# Altium footprint library YQPOWER.PcbLib: 215 footprints (part 8 of 14)
Each footprint in its own frame and in the unit in brackets; x right, y up, seen from the top. Pads: shape width x height; smd on the part's side, far side on the other; paste and mask are expansions set on the pad; w line width, h text height; cw(c..) or ccw(c..) is an arc to the next point about the centre after c.
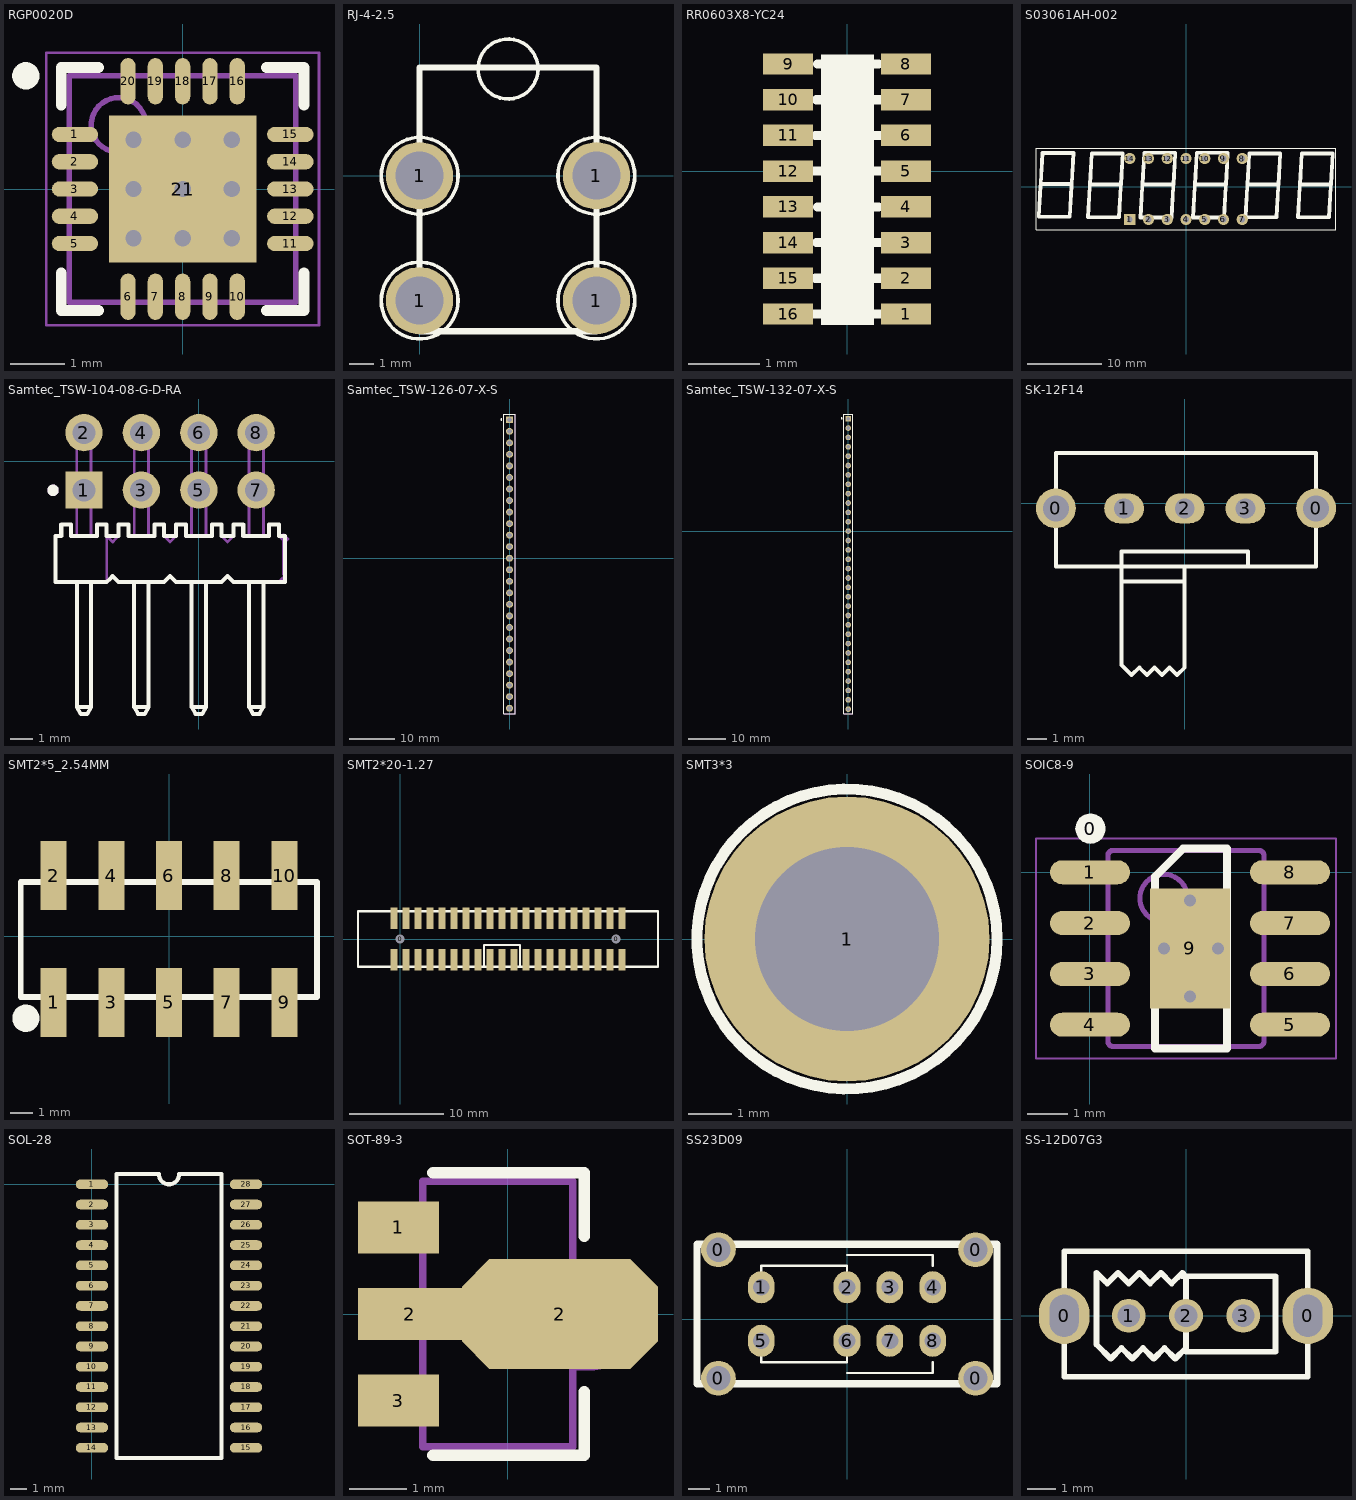
[diagram p7: the footprints below, top view; thin cyan lines are the x and y axes]

## RGP0020D [mm] "QFN, 20-Leads, Body 4x4mm, Pitch 0.5mm, Thermal Pad 2.7x2.7mm, TI Recommended"
height 1
pads (21):
  oval 0.85x0.28 smd paste-0.025 mask+0.07: 1(-1.975,1) 2(-1.975,0.5) 3(-1.975,0) 4(-1.975,-0.5) 5(-1.975,-1) 11(1.975,-1) 12(1.975,-0.5) 13(1.975,0) 14(1.975,0.5) 15(1.975,1)
  oval 0.28x0.85 smd paste-0.025 mask+0.07: 6(-1,-1.975) 7(-0.5,-1.975) 8(0,-1.975) 9(0.5,-1.975) 10(1,-1.975) 16(1,1.975) 17(0.5,1.975) 18(0,1.975) 19(-0.5,1.975) 20(-1,1.975)
  rect 2.7x2.7 smd paste-1.35 mask+0.07: 21(0,0)
via -0.9,0.9 diameter 0.5 hole 0.3
via 0,-0.9 diameter 0.5 hole 0.3
via -0.9,-0.9 diameter 0.5 hole 0.3
via 0.9,0 diameter 0.5 hole 0.3
via 0,0 diameter 0.5 hole 0.3
via -0.9,0 diameter 0.5 hole 0.3
via 0.9,-0.9 diameter 0.5 hole 0.3
via 0,0.9 diameter 0.5 hole 0.3
via 0.9,0.9 diameter 0.5 hole 0.3
Top Overlay:
  circle w0.25: c-2.875,2.075 r0.125
  lines w0.2: -2.225,-1.54 -2.225,-2.225 -1.54,-2.225 ; -2.225,1.54 -2.225,2.225 -1.54,2.225 ; 1.54,-2.225 2.225,-2.225 2.225,-1.54 ; 1.54,2.225 2.225,2.225 2.225,1.54
Top Paste:
  rectangle: 0.15,0.15 1.25,1.25
  region: -0.15,1.25 -1.25,1.25 -1.25,0.15 -0.15,0.15
  region: -0.15,-0.15 -1.25,-0.15 -1.25,-1.25 -0.15,-1.25
  rectangle: 0.15,-1.25 1.25,-0.15
Mechanical 5:
  circle w0.1: c-1.175,1.175 r0.5
  lines w0.1: -2.075,-2.075 2.075,-2.075 2.075,2.075 -2.075,2.075 -2.075,-2.075
  text ".Designator" at -1.854,-0.508 h1.02
Mechanical 15:
  lines w0.05: -2.5,-2.5 2.5,-2.5 2.5,2.5 -2.5,2.5 -2.5,-2.5
  lines w0.1: -0.5,0 0.5,0 ; 0,-0.5 0,0.5
3D body: height 1, standoff 0, extent -2.075,-2.075 2.075,2.075

## RJ-4-2.5 [mm]
pads (4):
  round 2.8 hole 2: 1(0,-5.2) 1(0,0) 1(7.366,-5.2) 1(7.366,0)
Top Overlay:
  circle w0.15: c7.366,0 r1.6
  circle w0.15: c0,0 r1.6
  circle w0.15: c7.366,-5.2 r1.6
  circle w0.15: c0,-5.2 r1.6
  circle w0.15: c3.683,4.445 r1.25
  lines w0.254: 7.239,-6.477 -0.011,-6.477 -0.011,4.5 7.366,4.5 7.366,-6.477 ; 7.239,-6.477 7.366,-6.477 ; 7.239,-6.477 7.366,-6.477

## RR0603X8-YC24 [mm] "排阻"
pads (16):
  rect 0.7x0.3 smd: 1(0.825,-2) 2(0.825,-1.5) 3(0.825,-1) 4(0.825,-0.5) 5(0.825,0) 6(0.825,0.5) 7(0.825,1) 8(0.825,1.5) 9(-0.825,1.5) 10(-0.825,1) 11(-0.825,0.5) 12(-0.825,0) 13(-0.825,-0.5) 14(-0.825,-1) 15(-0.825,-1.5) 16(-0.825,-2)
Top Overlay:
  region: 0.375,1.632 -0.365,1.632 -0.365,-2.157 0.375,-2.157
  lines w0.127: -0.455,-2 0.455,-2 ; -0.455,0 0.455,0 ; -0.445,-1.5 0.455,-1.5 ; -0.445,0.5 0.455,0.5 ; -0.425,-1 0.455,-1 ; -0.425,1 0.455,1 ; -0.415,-0.5 0.445,-0.5 ; -0.415,1.5 0.445,1.5

## S03061AH-002 [mil] "6位数码管"
pads (14):
  rect 60x60 hole 30: 1(-300,-175)
  round 60 hole 30: 2(-200,-175) 3(-100,-175) 4(0,-175) 5(100,-175) 6(200,-175) 7(300,-175) 8(300,150) 9(200,150) 10(100,150) 11(0,150) 12(-100,150) 13(-200,150) 14(-300,150)
Top Overlay:
  lines w5: -800,-230 -800,205 800,205 800,-230 -800,-230
  lines w19.68: -776.3,5.35 -785.35,-160 -620,-160 -610.94,5.35 ; -513.94,2.65 -523,-162.7 -357.65,-162.7 -348.59,2.65 ; -233.94,2.65 -243.13,-165 -77.77,-165 -68.59,2.65 ; -223,177.3 -232.06,11.94 -66.7,11.94 -57.65,177.3 ; -223,180.84 -57.65,180.84 ; 46.06,2.65 36.87,-165 202.23,-165 211.41,2.65 ; 57,177.3 47.94,11.94 213.3,11.94 222.35,177.3 ; 57,180.84 222.35,180.84 ; 326.06,2.65 317,-162.7 482.35,-162.7 491.41,2.65 ; 606.06,2.65 597,-162.7 762.35,-162.7 771.41,2.65 ; -774.41,14.65 -609.06,14.65 -600,180 -765.35,180 -774.41,14.65 ; -512.06,11.94 -503,177.3 -337.65,177.3 -346.7,11.94 -512.06,11.94 ; 327.94,11.94 337,177.3 502.35,177.3 493.3,11.94 327.94,11.94 ; 607.94,11.94 617,177.3 782.35,177.3 773.3,11.94 607.94,11.94

## Samtec_TSW-104-08-G-D-RA [mm] "Samtec Right Angle Header"
height 5.563
pads (8):
  rect 1.65x1.65 hole 1 mask+0: 1(-5.08,-1.27)
  round 1.65 hole 1 mask+0: 2(-5.08,1.27) 3(-2.54,-1.27) 4(-2.54,1.27) 5(0,-1.27) 6(0,1.27) 7(2.54,-1.27) 8(2.54,1.27)
Top Overlay:
  circle w0.25: c-6.45,-1.28 r0.125
  lines w0.178: -5.397,-5.334 -5.397,-10.871 ; -4.763,-5.334 -4.763,-10.871 ; -2.857,-5.334 -2.857,-10.871 ; -2.222,-5.334 -2.222,-10.871 ; -0.318,-5.334 -0.318,-10.871 ; 0.318,-5.334 0.318,-10.871 ; 2.222,-5.334 2.222,-10.871 ; 2.857,-5.334 2.857,-10.871 ; -5.397,-10.871 -5.222,-11.176 -4.938,-11.176 -4.763,-10.871 ; -5.397,-10.871 -4.763,-10.871 ; -2.857,-10.871 -2.682,-11.176 -2.398,-11.176 -2.222,-10.871 ; -2.857,-10.871 -2.222,-10.871 ; -0.318,-10.871 -0.142,-11.176 0.142,-11.176 0.318,-10.871 ; -0.318,-10.871 0.318,-10.871 ; 2.222,-10.871 2.857,-10.871 ; 2.222,-10.871 2.398,-11.176 2.682,-11.176 2.857,-10.871 ; -6.35,-5.334 -6.35,-3.302 -6.086,-3.302 -6.086,-2.794 -5.654,-2.794 -5.654,-3.302 -4.506,-3.302 -4.506,-2.794 -4.074,-2.794 -4.074,-3.302 -3.546,-3.302 -3.546,-2.794 -3.114,-2.794 -3.114,-3.302 -1.966,-3.302 -1.966,-2.794 -1.534,-2.794 -1.534,-3.302 -1.006,-3.302 -1.006,-2.794 -0.574,-2.794 -0.574,-3.302 0.574,-3.302 0.574,-2.794 1.006,-2.794 1.006,-3.302 1.534,-3.302 1.534,-2.794 1.966,-2.794 1.966,-3.302 3.114,-3.302 3.114,-2.794 3.546,-2.794 3.546,-3.302 3.81,-3.302 3.81,-5.334 1.534,-5.334 1.397,-5.197 1.27,-5.07 1.143,-5.197 1.006,-5.334 -1.006,-5.334 -1.143,-5.197 -1.27,-5.07 -1.397,-5.197 -1.534,-5.334 -3.546,-5.334 -3.683,-5.197 -3.81,-5.07 -3.937,-5.197 -4.074,-5.334 -6.35,-5.334
Mechanical 5:
  circle w0.25: c-6.45,-1.28 r0.125
  lines w0.127: -5.397,-5.334 -5.397,-10.871 ; -5.397,-3.302 -5.397,0.826 -5.397,1.587 -4.763,1.587 -4.763,0.826 -4.763,-3.302 ; -4.763,-5.334 -4.763,-10.871 ; -2.857,-5.334 -2.857,-10.871 ; -2.857,-3.302 -2.857,0.826 -2.857,1.587 -2.222,1.587 -2.222,0.826 -2.222,-3.302 ; -2.222,-5.334 -2.222,-10.871 ; -0.318,-5.334 -0.318,-10.871 ; -0.318,-3.302 -0.318,0.826 -0.318,1.587 0.318,1.587 0.318,0.826 0.318,-3.302 ; 0.318,-5.334 0.318,-10.871 ; 2.222,-5.334 2.222,-10.871 ; 2.222,-3.302 2.222,0.826 2.222,1.587 2.857,1.587 2.857,0.826 2.857,-3.302 ; 2.857,-5.334 2.857,-10.871 ; 3.746,-5.006 3.746,-3.249 3.937,-3.439 3.81,-3.566 3.683,-3.439 3.546,-3.302 3.546,-2.794 3.114,-2.794 3.114,-3.302 1.966,-3.302 1.966,-2.794 1.534,-2.794 1.534,-3.302 1.397,-3.439 1.27,-3.566 1.143,-3.439 1.006,-3.302 1.006,-2.794 0.574,-2.794 0.574,-3.302 -0.574,-3.302 -0.574,-2.794 -1.006,-2.794 -1.006,-3.302 -1.143,-3.439 -1.27,-3.566 -1.397,-3.439 -1.534,-3.302 -1.534,-2.794 -1.966,-2.794 -1.966,-3.302 -3.114,-3.302 -3.114,-2.794 -3.546,-2.794 -3.546,-3.302 -3.683,-3.439 -3.81,-3.566 -3.937,-3.439 -4.074,-3.302 ; 3.81,-5.07 3.683,-5.197 3.546,-5.334 1.534,-5.334 1.397,-5.197 1.27,-5.07 1.143,-5.197 1.006,-5.334 -1.006,-5.334 -1.143,-5.197 -1.27,-5.07 -1.397,-5.197 -1.534,-5.334 -3.546,-5.334 -3.683,-5.197 -3.81,-5.07 -3.937,-5.197 -4.074,-5.334 ; -5.397,-10.871 -4.763,-10.871 ; -5.397,-10.871 -5.222,-11.176 -4.938,-11.176 -4.763,-10.871 ; -4.074,-5.334 -6.35,-5.334 -6.35,-3.302 -6.086,-3.302 -6.086,-2.794 -5.654,-2.794 -5.654,-3.302 -4.506,-3.302 -4.506,-2.794 -4.074,-2.794 -4.074,-3.302 ; -4.074,-5.334 -4.074,-3.302 ; -2.857,-10.871 -2.222,-10.871 ; -2.857,-10.871 -2.682,-11.176 -2.398,-11.176 -2.222,-10.871 ; -0.318,-10.871 0.318,-10.871 ; -0.318,-10.871 -0.142,-11.176 0.142,-11.176 0.318,-10.871 ; 2.222,-10.871 2.398,-11.176 2.682,-11.176 2.857,-10.871 ; 2.222,-10.871 2.857,-10.871
  text ".Designator" at -5.91,-7.42 h1.02
3D body: height 5.64, standoff -2.24, extent -6.35,-11.176 3.81,1.588

## Samtec_TSW-126-07-X-S [mil] "Samtec"
height 330
pads (26):
  rect 60x60 hole 40: 1(0,1200)
  round 60 hole 40: 2(0,1100) 3(0,1000) 4(0,900) 5(0,800) 6(0,700) 7(0,600) 8(0,500) 9(0,400) 10(0,300) 11(0,200) 12(0,100) 13(0,0) 14(0,-100) 15(0,-200) 16(0,-300) 17(0,-400) 18(0,-500) 19(0,-600) 20(0,-700) 21(0,-800) 22(0,-900) 23(0,-1000) 24(0,-1100) 25(0,-1200) 26(0,-1300)
Top Overlay:
  circle w10: c-71.23,1202.35 r5.35
  lines w7: -50,-1350 50,-1350 50,1250 -50,1250 -50,-1350
Mechanical 5:
  rectangle: -26.47,1174.63 26.59,1224.38
  lines w5: -50,-1350 50,-1350 50,1250 -50,1250 -50,-1350
  text ".Designator" at -20,80 h40
3D body "Samtec_TSW-125-07-X-S.stp": height 330.6, standoff -99.4, extent -50,-1350 50,1150

## Samtec_TSW-132-07-X-S [mil] "Samtec"
height 330
pads (32):
  rect 60x60 hole 40: 1(0,1200)
  round 60 hole 40: 2(0,1100) 3(0,1000) 4(0,900) 5(0,800) 6(0,700) 7(0,600) 8(0,500) 9(0,400) 10(0,300) 11(0,200) 12(0,100) 13(0,0) 14(0,-100) 15(0,-200) 16(0,-300) 17(0,-400) 18(0,-500) 19(0,-600) 20(0,-700) 21(0,-800) 22(0,-900) 23(0,-1000) 24(0,-1100) 25(0,-1200) 26(0,-1300) 27(0,-1400) 28(0,-1500) 29(0,-1600) 30(0,-1700) 31(0,-1800) 32(0,-1900)
Top Overlay:
  circle w10: c-71.23,1202.35 r5.35
  lines w7: -50,-1951.57 -50,1250 50,1250 50,-1951.57 -50,-1951.57
Mechanical 5:
  rectangle: -26.47,1174.63 26.59,1224.38
  lines w5: -50,-1949.61 -50,1250 50,1250 50,-1949.61 -50,-1949.61
  text ".Designator" at -20,80 h40
3D body: height 10, standoff 0, extent -50,-1950.79 50,1250

## SK-12F14 [mm] "开关选择"
pads (5):
  round 2 hole 1.3: 0(-6.477,-0.254) 0(6.604,-0.254)
  oval 2x1.5 hole 1: 1(-3.048,-0.254) 2(0,-0.254) 3(3.048,-0.254)
Top Overlay:
  lines w0.2: -6.477,-3.175 6.604,-3.175 6.604,2.54 -6.477,2.54 -6.477,-3.16 ; -3.175,-3.937 0,-3.937 ; -3.175,-3.207 -3.175,-8.128 -2.73,-8.572 ; -3.175,-3.111 -3.175,-2.476 ; -3.175,-2.413 3.175,-2.413 3.175,-3.175 ; -2.667,-8.636 -2.286,-8.255 -1.905,-8.636 -1.524,-8.255 -1.143,-8.636 -0.762,-8.255 -0.381,-8.636 0,-8.255 0,-8.128 0,-3.175

## SMT2*5_2.54MM [mil]
pads (10):
  rect 45x120 smd: 1(-200.79,-115.12) 2(-200.79,104.88) 3(-100.79,-115.12) 4(-100.79,104.88) 5(-0.79,-115.12) 6(-0.79,104.88) 7(99.21,-115.12) 8(99.21,104.88) 9(199.21,-115.12) 10(199.21,104.88)
Top Overlay:
  circle w23.62: c-248.82,-142.52 r11.81
  lines w10: -257.87,-105.51 255.91,-105.51 255.91,93.7 -257.87,93.7 -257.87,-105.51
Mechanical 5:
  lines w5: -216.79,-160.12 -216.79,-102.62 ; -216.79,92.38 -216.79,149.88 ; -214.03,-155 -182.03,-155 ; -214.03,155 -182.03,155 ; -184.79,-160.12 -184.79,-102.62 ; -184.79,92.38 -184.79,149.88 ; -116.79,-160.12 -116.79,-102.62 ; -116.79,92.38 -116.79,149.88 ; -114.03,-155 -82.03,-155 ; -114.03,155 -82.03,155 ; -84.79,-160.12 -84.79,-102.62 ; -84.79,92.38 -84.79,149.88 ; -16.79,-160.12 -16.79,-102.62 ; -16.79,92.38 -16.79,149.88 ; -14.03,-155 17.97,-155 ; -14.03,155 17.97,155 ; 15.21,-160.12 15.21,-102.62 ; 15.21,92.38 15.21,149.88 ; 83.21,-160.12 83.21,-102.62 ; 83.21,92.38 83.21,149.88 ; 85.97,-155 117.97,-155 ; 85.97,155 117.97,155 ; 115.21,-160.12 115.21,-102.62 ; 115.21,92.38 115.21,149.88 ; 183.21,-160.12 183.21,-102.62 ; 183.21,92.38 183.21,149.88 ; 185.97,-155 217.97,-155 ; 185.97,155 217.97,155 ; 215.21,-160.12 215.21,-102.62 ; 215.21,92.38 215.21,149.88

## SMT2*20-1.27 [mm] "SMT 1.27MM"
pads (42):
  round 0.9 hole 0.9: 0(0,0) 0(22.86,0)
  rect 0.74x2.3 smd: 1(-0.635,-2.2) 2(0.635,-2.2) 3(1.905,-2.2) 4(3.175,-2.2) 5(4.445,-2.2) 6(5.715,-2.2) 7(6.985,-2.2) 8(8.255,-2.2) 9(9.525,-2.2) 10(10.795,-2.2) 11(12.065,-2.2) 12(13.335,-2.2) 13(14.605,-2.2) 14(15.875,-2.2) 15(17.145,-2.2) 16(18.415,-2.2) 17(19.685,-2.2) 18(20.955,-2.2) 19(22.225,-2.2) 20(23.495,-2.2) 21(23.495,2.2) 22(22.225,2.2) 23(20.955,2.2) 24(19.685,2.2) 25(18.415,2.2) 26(17.145,2.2) 27(15.875,2.2) 28(14.605,2.2) 29(13.335,2.2) 30(12.065,2.2) 31(10.795,2.2) 32(9.525,2.2) 33(8.255,2.2) 34(6.985,2.2) 35(5.715,2.2) 36(4.445,2.2) 37(3.175,2.2) 38(1.905,2.2) 39(0.635,2.2) 40(-0.635,2.2)
Top Overlay:
  lines w0.254: 8.89,-2.921 8.89,-0.635 12.7,-0.635 12.7,-2.921 ; -4.445,-2.921 -4.445,2.921 27.305,2.921 27.305,-2.921 -4.445,-2.921

## SMT3*3 [mm]
height 1.35
pads (1):
  round 6.5 hole 4.2: 1(0,0)
Top Overlay:
  circle w0.254: c0,0 r3.42
Top Paste:
  circle w1.2: c0,0 r2.7

## SOIC8-9 [mm]
pads (10):
  round 0.762 on Top Overlay: 0(0.012,1.092)
  oval 2x0.6 smd: 1(0,0) 2(0,-1.27) 3(0,-2.54) 4(0,-3.81) 5(5,-3.81) 6(5,-2.54) 7(5,-1.27) 8(5,0)
  rect 2x3 smd: 9(2.5,-1.905)
via 3.2,-1.905 diameter 0.6 hole 0.3
via 1.854,-1.905 diameter 0.6 hole 0.3
via 2.5,-3.105 diameter 0.6 hole 0.3
via 2.5,-0.705 diameter 0.6 hole 0.3
Top Overlay:
  lines w0.2: 1.629,-4.405 3.429,-4.405 3.429,0.595 2.329,0.595 1.629,-0.105 1.629,-4.405
Mechanical 5:
  lines w0.127: 0.025,-4 0.025,-3.62 ; 0.025,-4 -0.189,-4 -0.602,-4 -0.602,-3.62 -0.189,-3.62 0.025,-3.62 ; 0.025,-4 0.405,-4 0.448,-4 0.448,-3.62 0.405,-3.62 0.025,-3.62 ; 0.025,-2.73 0.025,-2.35 ; 0.025,-2.73 -0.189,-2.73 -0.602,-2.73 -0.602,-2.35 -0.189,-2.35 0.025,-2.35 ; 0.025,-2.73 0.405,-2.73 0.448,-2.73 0.448,-2.35 0.405,-2.35 0.025,-2.35 ; 0.025,-1.46 0.025,-1.08 ; 0.025,-1.46 -0.189,-1.46 -0.602,-1.46 -0.602,-1.08 -0.189,-1.08 0.025,-1.08 ; 0.025,-1.46 0.405,-1.46 0.448,-1.46 0.448,-1.08 0.405,-1.08 0.025,-1.08 ; 0.025,-0.19 0.025,0.19 ; 0.025,-0.19 -0.189,-0.19 -0.602,-0.19 -0.602,0.19 -0.189,0.19 0.025,0.19 ; 0.025,-0.19 0.405,-0.19 0.448,-0.19 0.448,0.19 0.405,0.19 0.025,0.19 ; 2.068,-4.355 2.218,-4.355 ; 2.068,-4.355 2.218,-4.355 ; 2.068,-4.355 0.575,-4.355 0.574,-4.355 cw(c0.575,-4.228) 0.448,-4.229 0.448,-4.228 0.448,0.418 0.448,0.419 cw(c0.575,0.418) 0.574,0.545 0.575,0.545 2.068,0.545 ; 2.068,0.545 2.218,0.545 ; 2.068,0.545 2.218,0.545 ; 2.218,-4.355 2.578,-4.355 ; 2.218,0.545 2.578,0.545 ; 2.578,-4.355 2.728,-4.355 ; 2.578,-4.355 2.728,-4.355 ; 2.578,0.545 2.728,0.545 ; 2.578,0.545 2.728,0.545 ; 2.728,-4.355 4.221,-4.355 ; 2.728,0.545 4.221,0.545 ; 4.222,-4.355 ccw(c4.221,-4.228) 4.348,-4.229 4.348,-4.228 4.348,0.418 4.348,0.419 ccw(c4.221,0.418) 4.222,0.545 ; 4.221,-4.355 4.222,-4.355 ; 4.221,0.545 4.222,0.545 ; 4.771,-4 4.771,-3.62 ; 4.771,-4 4.391,-4 4.348,-4 4.348,-3.62 4.391,-3.62 4.771,-3.62 ; 4.771,-4 4.985,-4 5.398,-4 5.398,-3.62 4.985,-3.62 4.771,-3.62 ; 4.771,-2.73 4.771,-2.35 ; 4.771,-2.73 4.391,-2.73 4.348,-2.73 4.348,-2.35 4.391,-2.35 4.771,-2.35 ; 4.771,-2.73 4.985,-2.73 5.398,-2.73 5.398,-2.35 4.985,-2.35 4.771,-2.35 ; 4.771,-1.46 4.771,-1.08 ; 4.771,-1.46 4.391,-1.46 4.348,-1.46 4.348,-1.08 4.391,-1.08 4.771,-1.08 ; 4.771,-1.46 4.985,-1.46 5.398,-1.46 5.398,-1.08 4.985,-1.08 4.771,-1.08 ; 4.771,-0.19 4.771,0.19 ; 4.771,-0.19 4.391,-0.19 4.348,-0.19 4.348,0.19 4.391,0.19 4.771,0.19 ; 4.771,-0.19 4.985,-0.19 5.398,-0.19 5.398,0.19 4.985,0.19 4.771,0.19 ; 1.845,-1.246 ccw(c1.845,-0.649) 1.845,-0.052 ccw(c1.845,-0.649) 1.845,-1.246
  text ".Designator" at 0.775,-2.53 h0.89
Mechanical 15:
  lines w0.05: -1.35,-4.655 6.15,-4.655 6.15,0.845 -1.35,0.845 -1.35,-4.655
  lines w0.1: 1.849,-1.905 2.849,-1.905 ; 1.949,-1.905 2.949,-1.905 ; 2.349,-2.405 2.349,-1.405 ; 2.449,-2.405 2.449,-1.405
3D body "SOIC-8akaD0008AakaM08A.stp": height 1.63, standoff 0, extent -0.6,-4.355 5.4,0.545

## SOL-28 [mil]
pads (28):
  oval 80x24 smd: 1(0,0) 2(0,-50) 3(0,-100) 4(0,-150) 5(0,-200) 6(0,-250) 7(0,-300) 8(0,-350) 9(0,-400) 10(0,-450) 11(0,-500) 12(0,-550) 13(0,-600) 14(0,-650) 15(380,-650) 16(380,-600) 17(380,-550) 18(380,-500) 19(380,-450) 20(380,-400) 21(380,-350) 22(380,-300) 23(380,-250) 24(380,-200) 25(380,-150) 26(380,-100) 27(380,-50) 28(380,0)
Top Overlay:
  lines w10: 60,-675 320,-675 320,25 215,25 cw(c190,25) 165,25 60,25 60,-675

## SOT-89-3 [mm] "SOT, 3-Leads, Body 4.6 x 2.6 mm, Pitch 1.5mm"
height 1.8
pads (4):
  rect 1.4x0.9 smd: 1(-1.9,1.5) 3(-1.9,-1.5)
  rect 1.8x0.9 smd: 2(-1.7,0)
  oct 3.4x1.9 smd: 2(0.9,0)
Top Overlay:
  lines w0.2: -1.3,-2.45 1.325,-2.45 1.325,-1.35 ; -1.3,2.45 1.325,2.45 1.325,1.35
Mechanical 5:
  lines w0.127: -2.414,-1.748 -2.414,-1.282 ; -2.414,-0.249 -2.414,0.218 -1.475,0.218 ; -2.414,1.252 -2.414,1.718 ; -2.407,-1.755 -1.475,-1.755 -1.475,-2.3 ; -2.407,1.245 -1.475,1.245 -1.475,0.222 ; -2.407,-1.275 -1.475,-1.275 -1.475,-0.255 -2.407,-0.255 ; -2.407,1.725 -1.475,1.725 -1.475,2.3 1.125,2.3 1.125,0.885 1.484,0.885 cw(c1.484,0.532) 1.836,0.532 1.836,-0.563 cw(c1.484,-0.563) 1.484,-0.915 1.125,-0.915 1.125,-2.3 -1.475,-2.3
  text ".Designator" at -0.65,1.9 h1.02
3D body "SOT89.stp": height 1.62, standoff 0.02, extent -2.424,-2.284 1.826,2.316

## SS23D09 [mil]
pads (12):
  round 65 hole 45: 0(-240,-110) 0(-240,130) 0(240,-110) 0(240,130)
  oval 50x60 hole 31.5: 1(-160,60) 2(0,60) 3(80,60) 4(160,60) 5(-160,-40) 6(0,-40) 7(80,-40) 8(160,-40)
Top Overlay:
  lines w3.94: -160,-60 -160,-80 0,-80 0,-60 ; -160,80 -160,100 0,100 0,80 ; 0,-100 160,-100 160,-80 ; 0,120 160,120 160,100
  lines w13.78: -240,-120 228.5,-120 ; -280,-120 -280,140 280,140 280,-120 -280,-120

## SS-12D07G3 [mm] "拨动开关SS-12D07G3"
height 3
pads (5):
  oval 1.8x2 hole 1.016 slot 1.5 at 90 deg: 0(-4.318,0) 0(4.318,0)
  round 1.2 hole 0.8: 1(-2.032,0) 2(0,0) 3(2.032,0)
Top Overlay:
  lines w0.2: -2.857,1.206 -3.175,1.524 -3.175,-1.016 -2.667,-1.524 -2.286,-1.143 -1.905,-1.524 -1.524,-1.143 -1.143,-1.524 -0.762,-1.143 -0.381,-1.524 0,-1.143 ; -2.794,1.143 -2.413,1.524 -2.032,1.143 -1.651,1.524 -1.27,1.143 -0.889,1.524 -0.508,1.143 -0.127,1.524 0,1.397 0,-1.27 3.175,-1.27 3.175,1.397 -0.127,1.397 ; -4.318,-2.159 -4.318,2.286 4.318,2.286 4.318,-2.159 -4.318,-2.159